# Altium footprint library MH_DA_THU_VIEN_16122016.PcbLib: 531 footprints (part 8 of 34)
Each footprint in its own frame and in the unit in brackets; x right, y up, seen from the top. Pads: shape width x height; smd on the part's side, far side on the other; paste and mask are expansions set on the pad; w line width, h text height; cw(c..) or ccw(c..) is an arc to the next point about the centre after c.
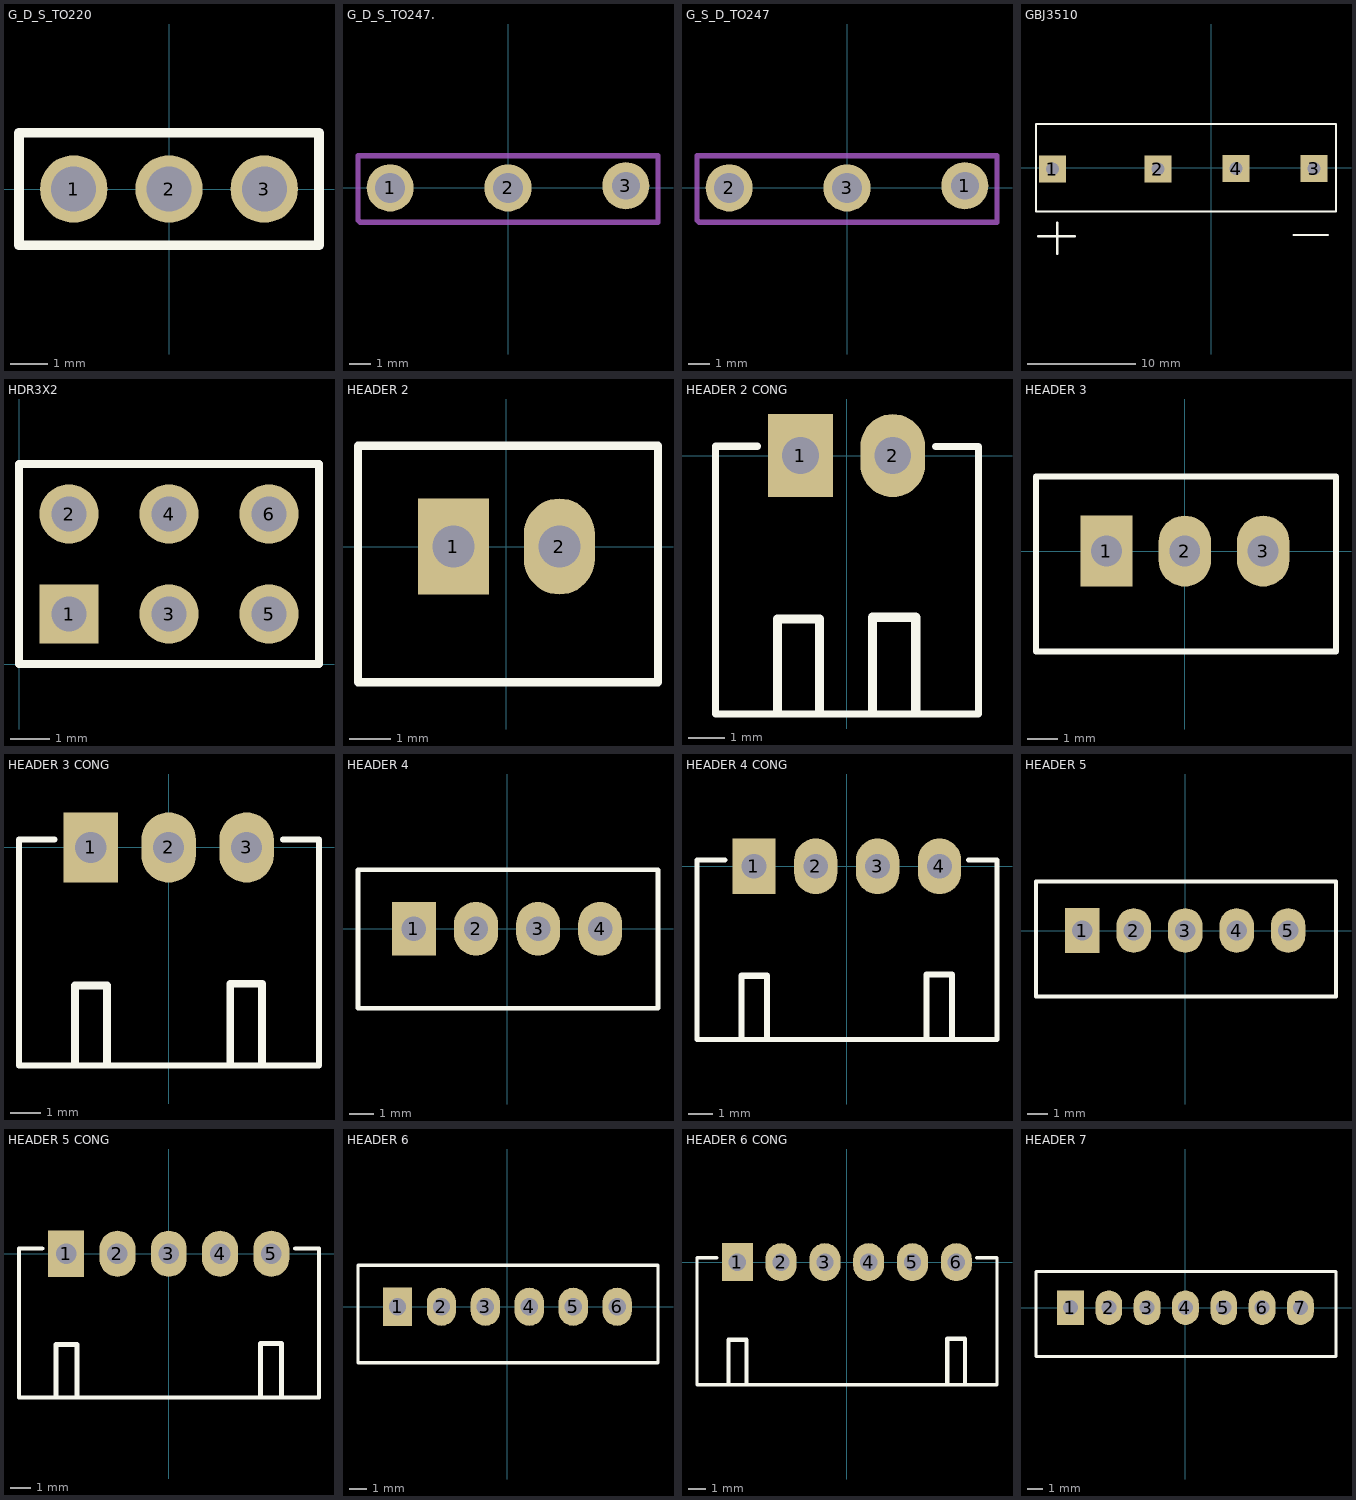
[diagram p7: the footprints below, top view; thin cyan lines are the x and y axes]

## G_D_S_TO220 [mm]
pads (3):
  round 1.8 hole 1.2: 1(-2.54,0) 2(0,0) 3(2.54,0)
Top Overlay:
  lines w0.254: -4,-1.5 -4,1.5 4,1.5 4,-1.5 -4,-1.5
3D body: height 20.36, standoff -12.52, extent -5.16,-1.705 5,2.5

## G_D_S_TO247. [mm]
pads (3):
  round 2.2 hole 1.4: 1(-5.5,0) 2(0,0)
  round 2.2 hole 1.3: 3(5.5,0.1)
Mechanical 1:
  lines w0.254: -7,-1.5 -6.9,-1.6 7,-1.6 7,1.5 -7,1.5 -7,-1.5
3D body: height 30.95, standoff -10.18, extent -7.9,-2.55 8,2.55

## G_S_D_TO247 [mm]
pads (3):
  round 2.2 hole 1.3: 1(5.5,0.1)
  round 2.2 hole 1.4: 2(-5.5,0) 3(0,0)
Mechanical 1:
  lines w0.254: -7,-1.5 -7,1.5 7,1.5 7,-1.6 -6.9,-1.6 -7,-1.5

## GBJ3510 [mil]
pads (4):
  rect 98.43x98.43 / inner round 62 / far side rect 98.43x98.43 hole 47.24: 1(-580,-5) 2(-195,-5) 3(375,-3.39) 4(90,-3.39)
Top Overlay:
  lines w8: -632.5,-250 -497.5,-250 ; -562.5,-315 -562.5,-200 ; 300,-245 425,-245 ; -640,-160 -640,160 455,160 455,-160 -640,-160
3D body: height 734.25, standoff -931.1, extent -556.69,-145 356.69,128.62

## HDR3X2 [mm]
pads (6):
  rect 1.5x1.5 hole 0.9: 1(1.27,1.27)
  round 1.5 hole 0.9: 2(1.27,3.81) 3(3.81,1.27) 4(3.81,3.81) 5(6.35,1.27) 6(6.35,3.81)
Top Overlay:
  lines w0.2: 2.752,0 7.62,0 ; 7.62,0 7.62,5.08 0,5.08 0,0 7.62,0

## HEADER 2 [mm]
pads (2):
  rect 1.7x2.3 hole 1: 1(-1.27,0)
  oval 1.7x2.3 hole 1: 2(1.27,0)
Top Overlay:
  lines w0.2: -3.556,-3.251 -3.556,2.413 3.632,2.413 3.632,-3.251 -3.556,-3.251

## HEADER 2 CONG [mil]
pads (2):
  rect 70x90 hole 40 unplated: 1(-50,0)
  oval 70x90 hole 40 unplated: 2(50,0)
Top Overlay:
  lines w7.87: -96.65,10 -142,10 -142,-280 142.8,-280 142.8,9.84 96.46,9.84
  lines w10: -75,-279 -75,-177 -29.5,-177 -29.5,-276 ; 28.07,-278.54 28.07,-175.2 ; 29.5,-175.2 75,-175.2 75,-278.54

## HEADER 3 [mm]
pads (3):
  rect 1.7x2.3 hole 1 paste+0: 1(-2.54,0)
  oval 1.7x2.3 hole 1 paste+0: 2(0,0) 3(2.54,0)
Top Overlay:
  lines w0.2: -4.826,-3.251 -4.826,2.413 4.902,2.413 4.902,-3.251 -4.826,-3.251

## HEADER 3 CONG [mil]
pads (3):
  rect 70x90 hole 40 unplated: 1(-100,0)
  oval 70x90 hole 40 unplated: 2(0,0) 3(100,0)
Top Overlay:
  lines w7.87: -146.65,10 -192,10 -192,-280 193,-280 193,10 146.65,10
  lines w10: -120,-276 -120,-177 -79,-177 -79,-279 ; 79,-277 79,-175 120,-175 120,-275 ; 118,-175 cw(c118,-176) 119,-176

## HEADER 4 [mm]
pads (4):
  rect 1.8x2.2 hole 1: 1(-3.81,0)
  oval 1.8x2.2 hole 1: 2(-1.27,0) 3(1.27,0) 4(3.81,0)
Top Overlay:
  lines w0.2: -6.096,-3.251 -6.096,2.413 6.172,2.413 6.172,-3.251 -6.096,-3.251

## HEADER 4 CONG [mil]
pads (4):
  rect 70x90 hole 40 unplated: 1(-150,0)
  oval 70x90 hole 40 unplated: 2(-50,0) 3(50,0) 4(150,0)
Top Overlay:
  lines w7.87: -196.65,10 -242,10 -242,-280 243,-280 243,10 196.65,10
  lines w10: -170,-276 -170,-177 -129,-177 -129,-279 ; 129,-279 129,-175 170,-175 170,-279 ; 168,-175 cw(c168,-176) 169,-176

## HEADER 5 [mm]
pads (5):
  rect 1.7x2.2 hole 1: 1(-5.08,0)
  oval 1.7x2.2 hole 1: 2(-2.54,0) 3(0,0) 4(2.54,0) 5(5.08,0)
Top Overlay:
  lines w0.2: -7.366,-3.251 7.442,-3.251 7.442,2.413 -7.366,2.413 -7.366,-3.251

## HEADER 5 CONG [mil]
pads (5):
  rect 70x90 hole 40 unplated: 1(-200,0)
  oval 70x90 hole 40 unplated: 2(-100,0) 3(0,0) 4(100,0) 5(200,0)
Top Overlay:
  lines w7.87: -246.65,10 -292,10 -292,-280 293,-280 293,10 246.65,10
  lines w10: -220,-276 -220,-177 -179,-177 -179,-279 ; 179,-279 179,-175 220,-175 220,-279 ; 218,-175 cw(c218,-176) 219,-176

## HEADER 6 [mm]
pads (6):
  rect 1.7x2.2 hole 1: 1(-6.35,0)
  oval 1.7x2.2 hole 1: 2(-3.81,0) 3(-1.27,0) 4(1.27,0) 5(3.81,0) 6(6.35,0)
Top Overlay:
  lines w0.2: -8.636,-3.251 -8.636,2.413 8.712,2.413 8.712,-3.251 -8.636,-3.251

## HEADER 6 CONG [mm]
pads (6):
  rect 1.8x2.2 hole 1: 1(-6.35,0)
  oval 1.8x2.2 hole 1: 2(-3.81,0) 3(-1.27,0) 4(1.27,0) 5(3.81,0) 6(6.35,0)
Top Overlay:
  lines w0.2: -7.535,0.254 -8.687,0.254 -8.687,-7.112 8.712,-7.112 8.712,0.254 7.535,0.254
  lines w0.254: -6.858,-7.01 -6.858,-4.496 -5.817,-4.496 -5.817,-7.087 ; 5.817,-7.087 5.817,-4.445 6.858,-4.445 6.858,-7.087

## HEADER 7 [mil]
pads (7):
  rect 70x90 hole 39.37 unplated: 1(-300,0)
  oval 70x90 hole 39.37 unplated: 2(-200,0) 3(-100,0) 4(0,0) 5(100,0) 6(200,0) 7(300,0)
Top Overlay:
  lines w7.87: -390,-128 -390,95 393,95 393,-128 -390,-128